# Altium footprint library decade_box_lib.PcbLib: 19 footprints (part 1 of 2)
Each footprint in its own frame and in the unit in brackets; x right, y up, seen from the top. Pads: shape width x height; smd on the part's side, far side on the other; paste and mask are expansions set on the pad; w line width, h text height; cw(c..) or ccw(c..) is an arc to the next point about the centre after c.
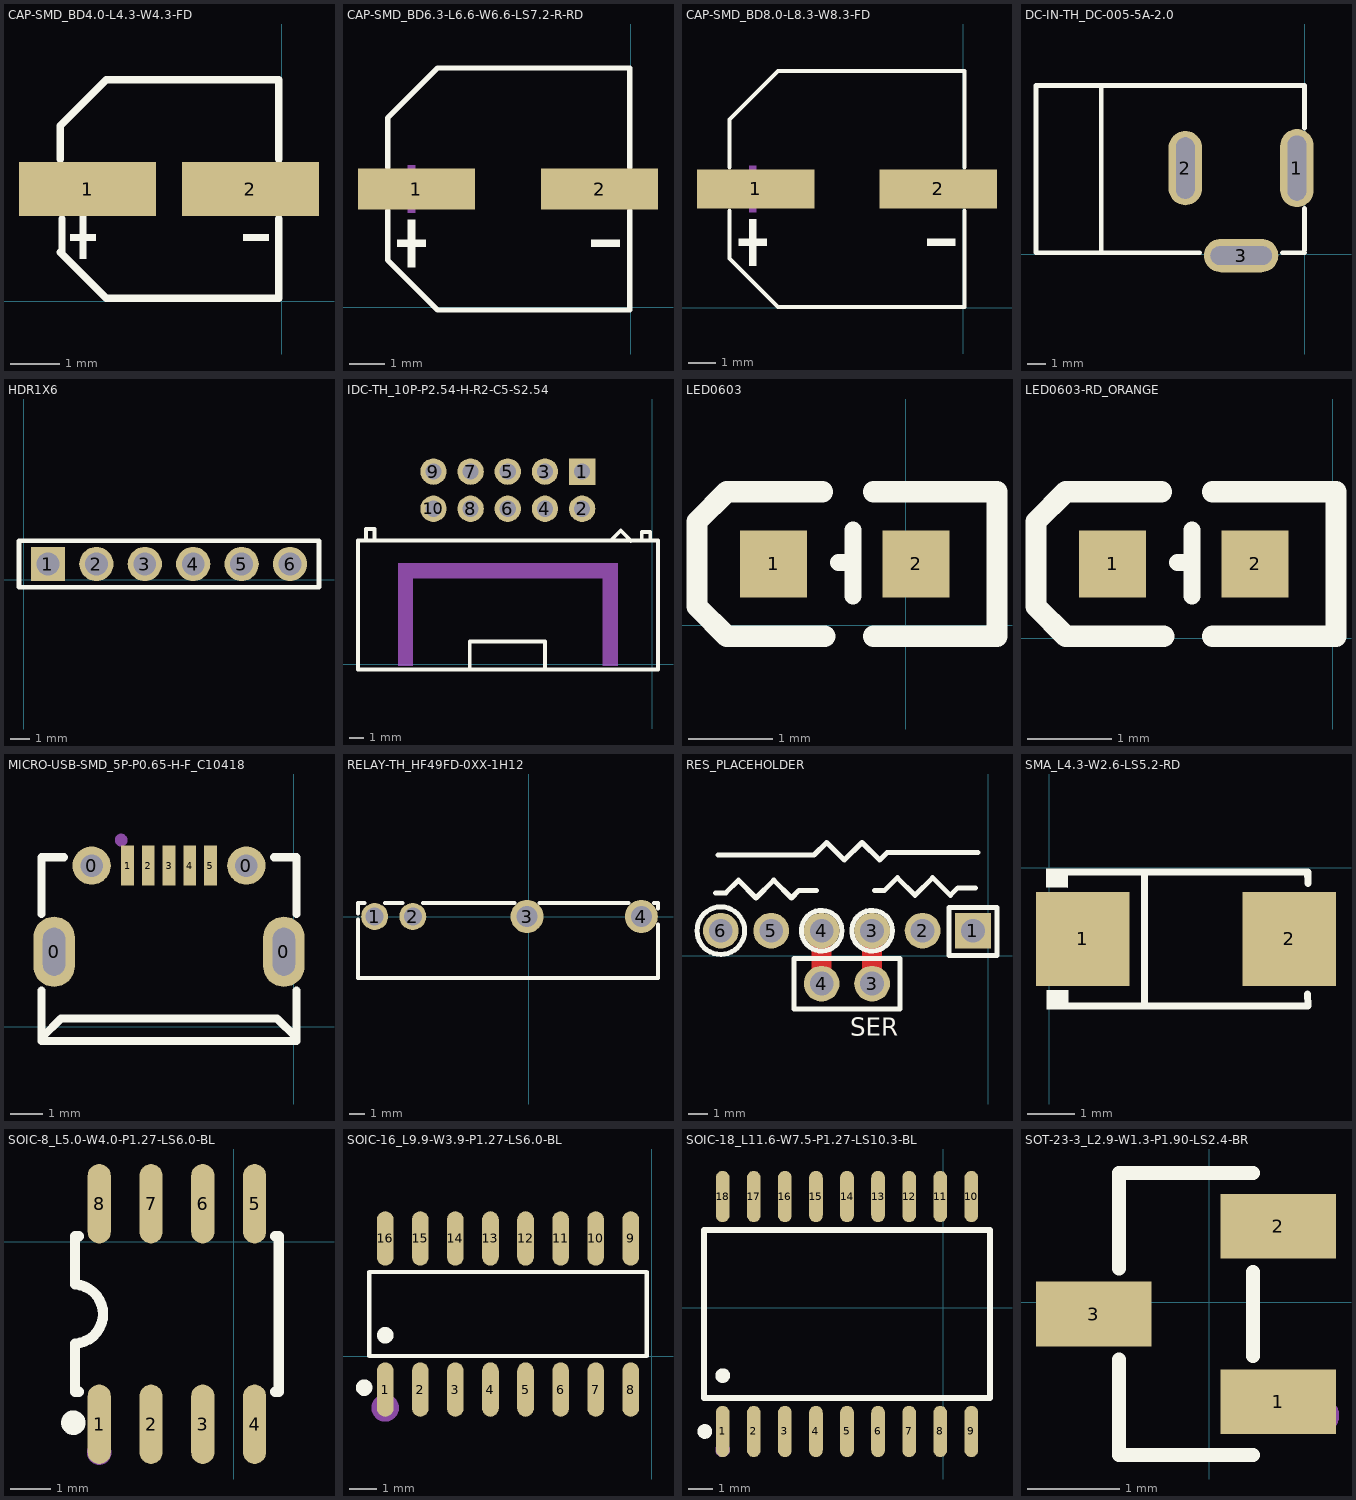
[diagram p0: the footprints below, top view; thin cyan lines are the x and y axes]

## CAP-SMD_BD4.0-L4.3-W4.3-FD [mm]
pads (2):
  rect 2.8x1.1 smd: 1(-3.956,2.286) 2(-0.635,2.286)
Top Overlay:
  region: -4.113,1.727 -4.113,0.867 -3.984,0.867 -3.984,1.727
  region: -4.307,1.361 -4.307,1.233 -3.791,1.233 -3.791,1.361
  region: -0.265,1.361 -0.265,1.233 -0.781,1.233 -0.781,1.361
  lines w0.152: -4.512,0.996 -3.576,0.06 -0.06,0.06 -0.06,1.679 ; -4.512,2.893 -4.512,3.576 -3.576,4.512 -0.06,4.512 -0.06,2.893 ; -4.479,0.996 -4.479,1.679
Mechanical 15:
  region: -4.113,2.716 -4.113,1.856 -3.984,1.856 -3.984,2.716
  region: -4.307,2.35 -4.307,2.222 -3.791,2.222 -3.791,2.35
  region: -0.265,2.35 -0.265,2.222 -0.781,2.222 -0.781,2.35

## CAP-SMD_BD6.3-L6.6-W6.6-LS7.2-R-RD [mm]
pads (2):
  rect 3.26x1.15 smd: 1(-5.984,3.302) 2(-0.874,3.302)
Top Overlay:
  region: -0.312,1.883 -0.312,1.685 -1.104,1.685 -1.104,1.883
  region: -6.516,1.883 -6.516,1.685 -5.724,1.685 -5.724,1.883
  region: -6.219,2.444 -6.219,1.124 -6.021,1.124 -6.021,2.444
  lines w0.152: -6.79,2.695 -6.79,1.322 -5.394,-0.074 -0.038,-0.074 -0.038,2.695 ; -6.79,3.909 -6.79,5.282 -5.394,6.678 -0.038,6.678 -0.038,3.909
Mechanical 15:
  region: -0.312,3.401 -0.312,3.203 -1.104,3.203 -1.104,3.401
  region: -6.516,3.401 -6.516,3.203 -5.724,3.203 -5.724,3.401
  region: -6.219,3.962 -6.219,2.642 -6.021,2.642 -6.021,3.962
3D body "asd.stp": height 7.05, standoff 0.05, extent -6.675,0.004 0.325,6.604

## CAP-SMD_BD8.0-L8.3-W8.3-FD [mm]
pads (2):
  rect 4.2x1.4 smd: 1(-7.433,4.245) 2(-0.899,4.245)
Top Overlay:
  region: -0.29,2.46 -0.29,2.211 -1.286,2.211 -1.286,2.46
  region: -8.042,2.46 -8.042,2.211 -7.046,2.211 -7.046,2.46
  region: -7.669,3.166 -7.669,1.506 -7.42,1.506 -7.42,3.166
  lines w0.152: -8.368,3.462 -8.368,1.755 -6.631,0.019 0.035,0.019 0.035,3.462 ; -8.368,5.027 -8.368,6.735 -6.631,8.471 0.035,8.471 0.035,5.027
Mechanical 15:
  region: -0.29,4.369 -0.29,4.12 -1.286,4.12 -1.286,4.369
  region: -8.042,4.369 -8.042,4.12 -7.046,4.12 -7.046,4.369
  region: -7.669,5.075 -7.669,3.415 -7.42,3.415 -7.42,5.075

## DC-IN-TH_DC-005-5A-2.0 [mm]
pads (3):
  oval 1.8x4.2 hole 1 slot 3.5 at 90 deg: 1(-0.429,4.638)
  oval 1.8x4 hole 1 slot 3.3 at 90 deg: 2(-6.429,4.638)
  oval 4x1.8 hole 1 slot 3.3 at 0 deg: 3(-3.429,-0.066)
Top Overlay:
  region: -14.457,9.091 -1.024,9.091 -1.016,9.083
  lines w0.254: -10.956,0.083 -10.956,9.083 ; -5.651,0.083 -14.457,0.083 -14.457,9.083 -0.049,9.083 ; -1.208,0.083 -0.026,0.083 ; -0.026,0.214 -0.026,2.481 ; -0.026,6.794 -0.026,9.083
3D body "asd.stp": height 11.02, standoff -3.97, extent -14.439,-0.127 -0.039,9.172

## HDR1X6 [mm]
pads (6):
  rect 1.8x1.8 hole 1.2: 1(1.266,0.839)
  round 1.8 hole 1.2: 2(3.806,0.839) 3(6.346,0.839) 4(8.886,0.839) 5(11.426,0.839) 6(13.966,0.839)
Top Overlay:
  lines w0.254: -0.254,-0.381 -0.254,2.059 15.486,2.059 15.486,-0.381 -0.254,-0.381
3D body "1x6.STEP": height 8.44, standoff -9.2, extent 0.015,-0.471 15.255,2.069

## IDC-TH_10P-P2.54-H-R2-C5-S2.54 [mm]
pads (10):
  rect 1.8x1.8 hole 1.1: 1(-4.796,13.168)
  round 1.8 hole 1.1: 2(-4.796,10.628) 3(-7.336,13.168) 4(-7.336,10.628) 5(-9.876,13.168) 6(-9.876,10.628) 7(-12.416,13.168) 8(-12.416,10.628) 9(-14.956,13.168) 10(-14.956,10.628)
Top Overlay:
  lines w0.254: -20.113,-0.358 0.387,-0.358 ; -20.113,-0.333 -20.113,8.468 ; -20.113,8.456 0.387,8.456 ; -19.566,8.583 -19.566,9.243 -18.982,9.243 -18.982,8.583 ; -12.493,-0.269 -12.467,-0.244 -12.467,1.56 ; -12.416,1.56 -7.336,1.56 -7.336,-0.269 -7.311,-0.294 ; -2.79,8.507 -2.155,9.142 -1.469,8.456 -1.469,8.43 ; -0.72,8.608 -0.72,9.04 -0.135,9.04 -0.135,8.634 ; 0.385,-0.344 0.385,8.456
Mechanical 15:
  region: -17.376,-0.102 -17.376,6.898 -2.376,6.898 -2.376,-0.102 -3.376,-0.102 -3.376,5.898 -16.376,5.898 -16.376,-0.102

## LED0603 [mm]
pads (2):
  rect 0.8x0.8 smd: 1(-1.575,0.729) 2(0.127,0.729)
Top Overlay:
  lines w0.203: -0.8,0.747 -0.625,0.747 ; -0.625,0.348 -0.625,1.136
  lines w0.254: -0.991,1.593 -2.134,1.593 -2.489,1.237 -2.489,0.221 -2.134,-0.134 -0.965,-0.134 ; -0.381,-0.134 1.092,-0.134 1.092,1.593 -0.381,1.593
Mechanical 15:
  region: -0.191,0.628 0.469,0.628 0.469,0.78 -0.191,0.78
  region: 0.084,1.004 0.084,0.344 0.237,0.344 0.237,1.004
  region: -1.864,0.645 -1.204,0.645 -1.204,0.797 -1.864,0.797

## LED0603-RD_ORANGE [mm]
pads (2):
  rect 0.8x0.8 smd: 1(-2.629,0.889) 2(-0.927,0.889)
Top Overlay:
  lines w0.203: -1.854,0.907 -1.679,0.907 ; -1.679,0.508 -1.679,1.295
  lines w0.254: -2.045,1.753 -3.188,1.753 -3.543,1.397 -3.543,0.381 -3.188,0.025 -2.019,0.025 ; -1.435,0.025 0.038,0.025 0.038,1.753 -1.435,1.753
Mechanical 15:
  region: -2.919,0.805 -2.258,0.805 -2.258,0.957 -2.919,0.957
  region: -0.97,1.164 -0.97,0.504 -0.817,0.504 -0.817,1.164
  region: -1.245,0.787 -0.585,0.787 -0.585,0.94 -1.245,0.94
3D body "asd.stp": height 0.83, standoff 0.02, extent -2.574,0.489 -0.954,1.289

## MICRO-USB-SMD_5P-P0.65-H-F_C10418 [mm]
pads (9):
  oval 1.3x2.2 hole 0.7 slot 1.5 at 90 deg: 0(-7.508,2.347) 0(-0.309,2.347)
  round 1.2 hole 0.7: 0(-6.334,5.047) 0(-1.484,5.047)
  rect 0.4x1.25 smd: 1(-5.209,5.047) 2(-4.559,5.047) 3(-3.909,5.047) 4(-3.259,5.047) 5(-2.609,5.047)
Top Overlay:
  lines w0.254: -7.909,-0.453 0.091,-0.452 0.091,1.134 ; -7.909,-0.432 -7.909,1.134 ; -7.909,3.534 -7.909,5.307 -7.194,5.307 ; -7.879,-0.432 -7.879,-0.333 -7.289,0.257 -0.519,0.257 0.071,-0.333 0.071,-0.453 ; -0.624,5.308 0.09,5.307 ; 0.092,3.534 0.091,5.308
Top Paste:
  circle w0.6: c-6.334,5.047 r0.3
  circle w0.6: c-1.484,5.047 r0.3
  region: -2.409,5.672 -2.409,4.422 -2.809,4.422 -2.809,5.672
  region: -3.059,5.672 -3.059,4.422 -3.459,4.422 -3.459,5.672
  region: -3.709,5.672 -3.709,4.422 -4.109,4.422 -4.109,5.672
  region: -4.359,5.672 -4.359,4.422 -4.759,4.422 -4.759,5.672
  region: -5.009,5.672 -5.009,4.422 -5.409,4.422 -5.409,5.672
  region: -0.959,2.797 -0.959,2.883 -0.914,3.048 -0.829,3.196 -0.708,3.318 -0.559,3.403 -0.394,3.447 -0.223,3.447 -0.058,3.403 0.091,3.318 0.212,3.196 0.297,3.048 0.341,2.883 0.341,2.797 0.341,1.897 0.341,1.812 0.297,1.646 0.212,1.498 0.091,1.377 -0.058,1.292 -0.223,1.247 -0.394,1.247 -0.559,1.292 -0.708,1.377 -0.829,1.498 -0.914,1.646 -0.959,1.812 -0.959,1.897
  region: -8.159,2.797 -8.159,2.883 -8.114,3.048 -8.029,3.196 -7.908,3.318 -7.759,3.403 -7.594,3.447 -7.423,3.447 -7.258,3.403 -7.109,3.318 -6.988,3.196 -6.903,3.048 -6.859,2.883 -6.859,2.797 -6.859,1.897 -6.859,1.812 -6.903,1.646 -6.988,1.498 -7.109,1.377 -7.258,1.292 -7.423,1.247 -7.594,1.247 -7.759,1.292 -7.908,1.377 -8.029,1.498 -8.114,1.646 -8.159,1.812 -8.159,1.897
Mechanical 15:
  circle w0.2: c-5.408,5.847 r0.1
3D body "asd.stp": height 2.61, standoff -1.12, extent -7.794,-0.508 0.174,6.192

## RELAY-TH_HF49FD-0XX-1H12 [mm]
pads (4):
  round 1.8 hole 1.2: 1(-10.287,0) 2(-7.747,0)
  round 2.2 hole 1.4: 3(-0.127,0) 4(7.493,0)
Top Overlay:
  lines w0.254: -11.397,-0.207 -11.397,-4.1 8.603,-4.1 8.603,-0.529 ; -11.397,0.207 -11.397,0.9 -10.971,0.9 ; -9.603,0.9 -8.431,0.9 ; -7.063,0.9 -0.966,0.9 ; 0.712,0.9 6.654,0.9 ; 8.332,0.9 8.509,0.9 ; 8.603,0.529 8.603,0.9
3D body "asd.stp": height 12.05, standoff -3.95, extent -11.496,-4.1 8.504,0.9

## RES_PLACEHOLDER [mm]
pads (8):
  rect 1.8x1.8 hole 1.2: 1(-0.762,1.27)
  round 1.8 hole 1.2: 2(-3.302,1.27) 3(-5.842,-1.397) 3(-5.842,1.27) 4(-8.382,-1.397) 4(-8.382,1.27) 5(-10.922,1.27) 6(-13.462,1.27)
Top Layer:
  lines w1: -8.382,-1.397 -8.382,1.27 ; -5.842,-1.397 -5.842,1.27
Top Overlay:
  circle w0.254: c-8.382,1.27 r1.024
  circle w0.254: c-5.842,1.27 r1.024
  circle w0.254: c-13.462,1.27 r1.198
  lines w0.254: -13.716,3.175 -13.208,3.175 -12.573,3.81 -11.684,2.921 -10.795,3.81 -9.906,2.921 -9.525,3.302 -8.636,3.302 ; -13.589,5.08 -8.763,5.08 -8.128,5.715 -7.239,4.826 -6.35,5.715 -5.461,4.826 -5.08,5.207 -0.508,5.207 ; -5.715,3.302 -5.207,3.302 -4.572,3.937 -3.683,3.048 -2.794,3.937 -1.905,3.048 -1.524,3.429 -0.635,3.429 ; -9.779,-2.667 -9.779,-0.127 -4.445,-0.127 -4.445,-2.667 -9.779,-2.667 ; -1.966,0.028 0.447,0.028 0.447,2.441 -1.966,2.441 -1.966,0.028
  text "SER" at -6.932,-4.011 h0.9
3D body "Pin Header 1x2 TH Pitch 2.54mm.stp": height 9.5, standoff -3.2, extent -9.652,-2.667 -4.572,-0.127
3D body "Female Pin Header 01x06 Pitch 2.54mm Height 8.5mm.stp": height 8.5, standoff -3.2, extent -14.732,0 0.508,2.54

## SMA_L4.3-W2.6-LS5.2-RD [mm]
pads (2):
  rect 2x2 smd: 1(0.721,-1.524) 2(5.121,-1.524)
Top Overlay:
  region: 0.409,-2.62 0.408,-3.027 -0.052,-3.022 -0.048,-2.62
  region: 0.401,-0.022 0.4,-0.428 -0.06,-0.424 -0.056,-0.022
  lines w0.152: 0.325,-2.95 5.517,-2.95 ; 0.325,-0.098 5.517,-0.098 5.524,-0.337 ; 2.037,-2.95 2.037,-0.098 ; 5.514,-2.7 5.521,-2.939
Mechanical 15:
  region: 4.935,-2.199 4.935,-0.849 4.732,-0.849 4.732,-2.199
  region: 5.211,-1.614 5.211,-1.412 4.401,-1.412 4.401,-1.614
  region: 0.604,-1.625 0.604,-1.423 1.414,-1.423 1.414,-1.625
3D body "asd.stp": height 2.12, standoff 0.02, extent 0.59,-2.796 5.285,-0.196

## SOIC-8_L5.0-W4.0-P1.27-LS6.0-BL [mil]
pads (8):
  oval 22.38x76.78 smd: 1(-130,-176.5) 2(-80,-176.5) 3(-30,-176.5) 4(20,-176.5) 5(20,36.5) 6(-30,36.5) 7(-80,36.5) 8(-130,36.5)
Top Overlay:
  circle w11.81: c-155,-175 r5.91
  lines w10: -153.43,-98.61 ccw(c-154.99,-70) -153.23,-41.41 ; -153.43,-98.61 -153.43,-129.06 -153.43,-145 -149.83,-145 ; -153.43,-41.41 -153.43,-10.95 -153.43,5 -149.83,5 ; 39.83,-145 43.42,-145 43.42,-129.06 43.42,-10.95 43.42,5 39.83,5
Mechanical 15:
  circle w11.81: c-130,-203.86 r5.91
3D body "asd.stp": height 68.22, standoff 0.54, extent -150,-188.11 39.57,48.11

## SOIC-16_L9.9-W3.9-P1.27-LS6.0-BL [mil]
pads (16):
  oval 23.7x77.6 smd: 1(-380,-47.7) 2(-330,-47.7) 3(-280,-47.7) 4(-230,-47.7) 5(-180,-47.7) 6(-130,-47.7) 7(-80,-47.7) 8(-30,-47.7) 9(-30,167.7) 10(-80,167.7) 11(-130,167.7) 12(-180,167.7) 13(-230,167.7) 14(-280,167.7) 15(-330,167.7) 16(-380,167.7)
Top Overlay:
  circle w11.81: c-380,29.72 r5.91
  circle w11.81: c-410,-45 r5.91
  lines w6: -402.88,0.1 -402.88,119.9 -7.12,119.9 -7.12,0.1 -402.88,0.1
Mechanical 15:
  circle w19.68: c-380,-73.86 r9.84
3D body "asd.stp": height 76.13, standoff 1.35, extent -399.88,-60.73 -10.12,175.73

## SOIC-18_L11.6-W7.5-P1.27-LS10.3-BL [mm]
pads (18):
  oval 0.56x2.1 smd: 1(-9.017,-5.054) 2(-7.747,-5.054) 3(-6.477,-5.054) 4(-5.207,-5.054) 5(-3.937,-5.054) 6(-2.667,-5.054) 7(-1.397,-5.054) 8(-0.127,-5.054) 9(1.143,-5.054) 10(1.143,4.546) 11(-0.127,4.546) 12(-1.397,4.546) 13(-2.667,4.546) 14(-3.937,4.546) 15(-5.207,4.546) 16(-6.477,4.546) 17(-7.747,4.546) 18(-9.017,4.546)
Top Overlay:
  circle w0.3: c-9.749,-5.054 r0.15
  circle w0.3: c-9.017,-2.773 r0.15
  lines w0.254: -9.779,-3.683 1.905,-3.683 1.905,3.175 -9.779,3.175 -9.779,-3.683
Mechanical 15:
  circle w0.3: c-9.017,-5.804 r0.15
3D body "asd.stp": height 2.89, standoff 0.04, extent -9.737,-5.326 1.863,5.08

## SOT-23-3_L2.9-W1.3-P1.90-LS2.4-BR [mm]
pads (3):
  rect 1.25x0.7 smd: 1(0.746,-1.077) 2(0.746,0.823) 3(-1.254,-0.127)
Top Overlay:
  lines w0.152: -0.98,-0.622 -0.98,-1.653 0.472,-1.653 ; -0.98,0.368 -0.98,1.399 0.472,1.399 ; 0.472,-0.582 0.472,0.328
Mechanical 15:
  circle w0.2: c1.206,-1.227 r0.1
3D body "asd.stp": height 1.06, standoff 0.01, extent -1.433,-1.584 1.067,1.309